# Altium footprint library CADTcommon.PcbLib: 503 footprints (part 20 of 32)
Each footprint in its own frame and in the unit in brackets; x right, y up, seen from the top. Pads: shape width x height; smd on the part's side, far side on the other; paste and mask are expansions set on the pad; w line width, h text height; cw(c..) or ccw(c..) is an arc to the next point about the centre after c.
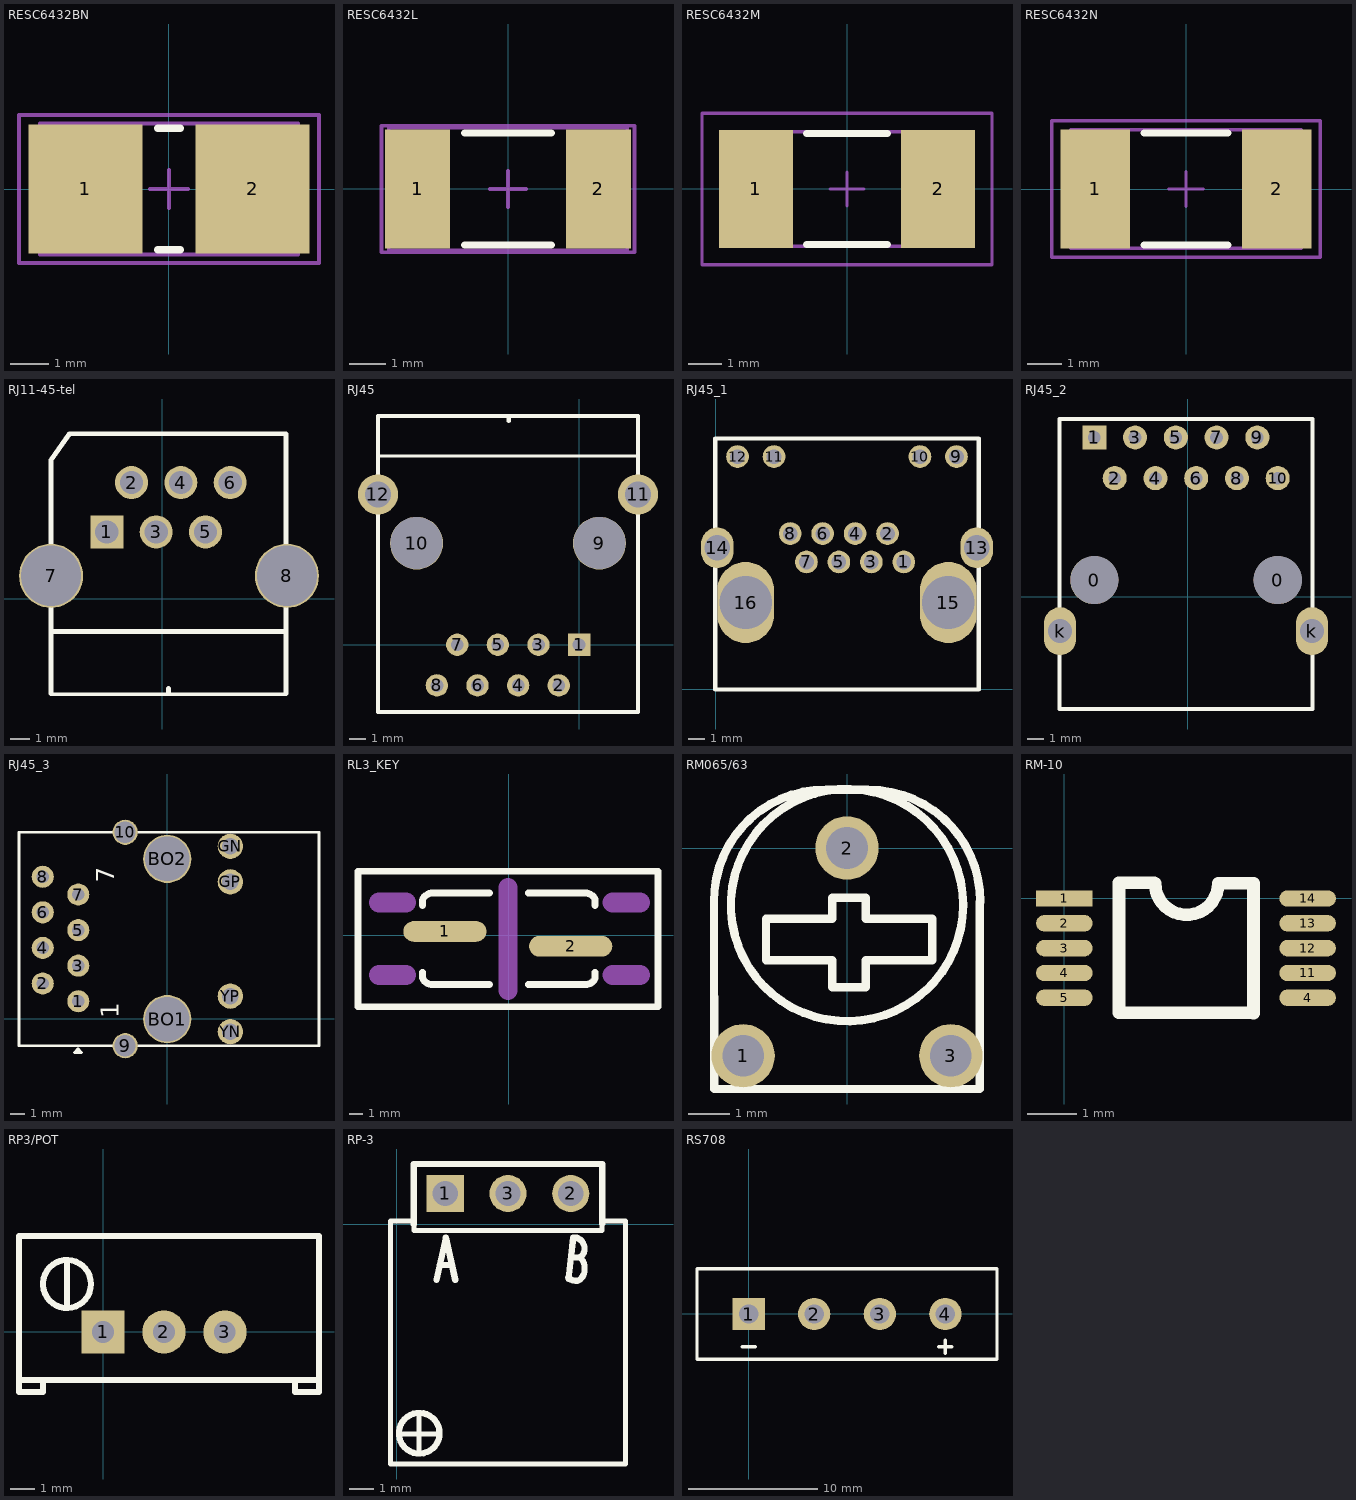
[diagram p19: the footprints below, top view; thin cyan lines are the x and y axes]

## RESC6432BN [mm] "Chip Resistor, Body 6.4x3.2mm, IPC Medium Density"
height 1.1
pads (2):
  rect 3x3.4 smd: 1(-2.2,0) 2(2.2,0)
Top Overlay:
  lines w0.2: -0.3,-1.6 0.3,-1.6 ; -0.3,1.6 0.3,1.6
Mechanical 13:
  lines w0.1: -3.4,-1.725 -3.4,1.725 3.4,1.725 3.4,-1.725 -3.4,-1.725
Mechanical 15:
  lines w0.1: -0.5,0 0.5,0 ; 0,-0.5 0,0.5 ; -3.95,-1.95 -3.95,1.95 3.95,1.95 3.95,-1.95 -3.95,-1.95
3D body: height 1.1, standoff 0, extent -3.4,-1.725 3.4,1.725

## RESC6432L [mm] "Chip Resistor, Body 6.4x3.2mm, IPC High Density"
height 1.2
pads (2):
  rect 1.8x3.3 smd: 1(-2.5,0) 2(2.5,0)
Top Overlay:
  lines w0.2: -1.2,-1.55 1.2,-1.55 ; -1.2,1.55 1.2,1.55
Mechanical 13:
  lines w0.1: -3.3,-1.7 -3.3,1.7 3.3,1.7 3.3,-1.7 -3.3,-1.7
Mechanical 15:
  lines w0.1: -0.5,0 0.5,0 ; 0,-0.5 0,0.5 ; -3.5,-1.75 -3.5,1.75 3.5,1.75 3.5,-1.75 -3.5,-1.75
3D body: height 1.2, standoff 0, extent -3.3,-1.7 3.3,1.7

## RESC6432M [mm] "Chip Resistor, Body 6.4x3.2mm, IPC Low Density"
height 1.2
pads (2):
  rect 2.2x3.5 smd: 1(-2.7,0) 2(2.7,0)
Top Overlay:
  lines w0.2: -1.2,-1.65 1.2,-1.65 ; -1.2,1.65 1.2,1.65
Mechanical 13:
  lines w0.1: -3.3,-1.7 3.3,-1.7 3.3,1.7 -3.3,1.7 -3.3,-1.7
Mechanical 15:
  lines w0.1: -0.5,0 0.5,0 ; 0,-0.5 0,0.5 ; -4.3,-2.25 4.3,-2.25 4.3,2.25 -4.3,2.25 -4.3,-2.25
3D body: height 1.2, standoff 0, extent -3.3,-1.7 3.3,1.7

## RESC6432N [mm] "Chip Resistor, Body 6.4x3.2mm, IPC Medium Density"
height 1.2
pads (2):
  rect 2x3.4 smd: 1(-2.6,0) 2(2.6,0)
Top Overlay:
  lines w0.2: -1.2,-1.6 1.2,-1.6 ; -1.2,1.6 1.2,1.6
Mechanical 13:
  lines w0.1: -3.3,-1.7 -3.3,1.7 3.3,1.7 3.3,-1.7 -3.3,-1.7
Mechanical 15:
  lines w0.1: -0.5,0 0.5,0 ; 0,-0.5 0,0.5 ; -3.85,-1.95 -3.85,1.95 3.85,1.95 3.85,-1.95 -3.85,-1.95
3D body: height 1.2, standoff 0, extent -3.3,-1.7 3.3,1.7

## RJ11-45-tel [mm]
pads (8):
  rect 1.7x1.7 hole 1.2: 1(-2.845,3.429)
  round 1.7 hole 1.2: 2(-1.575,5.969) 3(-0.305,3.429) 4(0.965,5.969) 5(2.235,3.429) 6(3.505,5.969)
  round 3.302 hole 3.1 unplated: 7(-5.715,1.168) 8(6.426,1.168)
Top Overlay:
  lines w0.203: -5.715,-4.928 6.375,-4.928
  lines w0.254: -5.715,-4.902 -5.715,7.137 -4.775,8.484 6.375,8.484 6.375,-4.902 ; -5.715,-1.702 6.35,-1.702 ; 0.33,-4.826 0.33,-4.626
3D body: height 3.77, standoff -10.45, extent -6.896,-7.312 7.963,8.988

## RJ45 [mil]
pads (12):
  rect 55x55 hole 31.5: 1(0,0)
  round 55 hole 31.5: 2(-50,-100) 3(-100,0) 4(-150,-100) 5(-200,0) 6(-250,-100) 7(-300,0) 8(-350,-100)
  round 130 hole 127.95 unplated: 9(50,250) 10(-400,250)
  round 98.42 hole 62.99: 11(145,370) 12(-495,370)
Top Overlay:
  lines w8: -488.19,464.57 141.73,464.57
  lines w10: -495,-165.35 144.65,-165.35 145,-165 145,370 145,562.99 -495,562.99 -495,370 -495,-165 ; -173.23,551.18 -173.23,559.06
3D body: height 127.85, standoff -555.12, extent -490,-172.17 139.92,556.17

## RJ45_1 [mil]
pads (16):
  round 56 hole 36: 1(464.02,314.02) 2(424.02,384.02) 3(384.02,314.02) 4(344.02,384.02) 5(304.02,314.02) 6(264.02,384.02) 7(224.02,314.02) 8(184.02,384.02) 9(594.02,574.02) 10(504.02,574.02) 11(144.02,574.02) 12(54.02,574.02)
  oval 80x100 hole 63: 13(644.02,349.02) 14(4.02,349.02)
  oval 140x200 hole 130: 15(574.02,214.02) 16(74.02,214.02)
Top Overlay:
  lines w10: -0.98,-0.98 -0.98,619.02 649.02,619.02 649.02,-0.98 -0.98,-0.98

## RJ45_2 [mm]
pads (14):
  round 3 hole 3: 0(-5.832,1.027) 0(5.598,1.027)
  rect 1.5x1.5 hole 0.8: 1(-5.832,9.917)
  round 1.5 hole 0.8: 2(-4.562,7.377) 3(-3.292,9.917) 4(-2.022,7.377) 5(-0.752,9.917) 6(0.518,7.377) 7(1.788,9.917) 8(3.058,7.377) 9(4.328,9.917) 10(5.598,7.377)
  oval 2x3 hole 1.5: k(-7.968,-2.162) k(7.732,-2.162)
Top Overlay:
  lines w0.254: -7.992,-7.013 -7.992,11.067 7.758,11.067 7.758,-7.013 -7.992,-7.013

## RJ45_3 [mil]
pads (16):
  round 62 hole 35: 1(-250.62,49.5) 2(-350.62,99.5) 3(-250.62,149.5) 4(-350.62,199.5) 5(-250.62,249.5) 6(-350.62,299.5) 7(-250.62,349.5) 8(-350.62,399.5)
  round 70.87 hole 59.06: 9(-118.73,-75.5) 10(-118.73,524.5)
  round 135 hole 125: BO1(-0.62,-0.5) BO2(-0.62,449.5)
  round 70.87 hole 47.24: GN(176.54,485.13) GP(176.54,385.13) YN(176.54,-36.13) YP(176.54,63.87)
Top Overlay:
  lines w8: -417.29,-75.5 425.82,-75.5 425.82,524.5 -417.29,524.5 -417.29,-75.5 ; -261.39,-94.04 -251.39,-84.04 -241.39,-94.04 -246.39,-94.04 -261.39,-94.04
  text "7" at -149.56,381.95 h50
  text "1" at -136.5,1.66 h50

## RL3_KEY [mm]
pads (2):
  oval 6x1.5 all layers, no hole: 1(-4.61,0.279) 2(4.458,-0.787)
Top Overlay:
  lines w0.5: -6.223,-2.667 -6.223,-2.995 ccw(c-5.789,-2.995) -6.096,-3.302 ccw(c-5.483,-2.689) -5.483,-3.556 -1.397,-3.556 ; -6.223,2.159 -6.223,2.487 cw(c-5.789,2.487) -6.096,2.794 cw(c-5.483,2.181) -5.483,3.048 -1.397,3.048 ; 1.397,-3.556 5.483,-3.556 ccw(c5.483,-2.689) 6.096,-3.302 ccw(c5.789,-2.995) 6.223,-2.995 6.223,-2.667 ; 1.397,3.048 5.483,3.048 cw(c5.483,2.181) 6.096,2.794 cw(c5.789,2.487) 6.223,2.487 6.223,2.159 ; -10.884,-5.156 -10.884,4.623 10.757,4.623 10.757,-5.156 -10.884,-5.156
Mechanical 1:
  lines w1.15: -6.871,0.279 -2.349,0.279 ; 2.197,-0.787 6.718,-0.787
  lines w1.4: -0.064,-3.962 -0.064,3.429
  lines w1.45: -9.373,-2.86 -7.417,-2.86 ; -9.373,2.362 -7.417,2.362 ; 7.493,-2.86 9.449,-2.86 ; 7.493,2.362 9.449,2.362

## RM065/63 [mm]
pads (3):
  round 1.524 hole 1: 1(-2.5,-5) 2(0,0) 3(2.5,-5)
Top Overlay:
  circle w0.203: c0,-1.375 r2.795
  lines w0.203: -0.5,1.4 0.5,1.4 ; -0.5,1.405 ccw(c-0.524,-1.273) -3.202,-1.3 -3.2,-5.8 3.2,-5.8 3.2,-1.3 ; 0.45,-2.7 0.45,-3.35 -0.35,-3.35 -0.35,-2.7 -1.95,-2.7 -1.95,-1.7 -0.35,-1.7 -0.35,-1.2 0.45,-1.2 0.45,-1.7 2.05,-1.7 2.05,-2.7 0.475,-2.7 ; 0.5,1.402 cw(c0.527,-1.276) 3.205,-1.3
3D body: height 7.7, standoff -3.1, extent -3.25,-5.799 3.25,1.444

## RM-10 [mm]
pads (10):
  rect 1.143x0.33 smd: 1(0,0)
  oval 1.143x0.33 smd: 2(0,-0.5) 3(0,-1) 4(0,-1.5) 4(4.9,-2) 5(0,-2) 11(4.9,-1.5) 12(4.9,-1) 13(4.9,-0.5) 14(4.9,0)
Top Overlay:
  lines w0.254: 1.814,0.32 1.1,0.32 1.1,-2.3 3.799,-2.3 ; 1.829,0.305 ccw(c2.464,0.305) 3.099,0.305 3.806,0.305 ; 3.81,-2.311 3.81,0.309

## RP3/POT [mm]
pads (3):
  rect 1.8x1.8 hole 0.9: 1(0,0)
  round 1.8 hole 0.9: 2(2.54,0) 3(5.08,0)
Top Overlay:
  circle w0.254: c-1.5,2 r1
  lines w0.254: -2.5,-2 -2.5,-2.5 -3.5,-2.5 -3.5,-2 ; -1.5,1 -1.5,3 ; 8,-2 8,-2.5 9,-2.5 9,-2 ; -3.5,-2 9,-2 ; -3.5,-2 -3.5,4 9,4 9,-2
3D body: height 12.46, standoff -5.04, extent -2.06,-2.438 7.14,2.362

## RP-3 [mil]
pads (3):
  rect 59.06x59.06 hole 40: 1(77,49)
  round 59.06 hole 40: 2(277,49) 3(177,49)
Top Overlay:
  circle w10: c35.61,-333 r32.39
  lines w7.87: 4,-334 67,-334 ; 35,-360 35,-304 ; 327,5 327,-10 27,-10 27,5 -10,5 -10,-382 364,-382 364,5 330,5
  lines w10: 27,0 27,96 327,96 327,1 ; 63,-89 78,-21 93,-89 ; 68.29,-65 87.71,-65 ; 273,-85 ccw(c285.07,-72.93) 285.07,-90 285.76,-90 ccw(c285.76,-79.76) 293,-87 ccw(c278.51,-72.51) 299,-72.51 299,-68.97 ccw(c277.34,-68.97) 292.66,-53.66 ; 273.56,-87.06 281,-21 ; 279,-53 289.1,-53 ccw(c289.1,-46) 294.05,-50.95 ccw(c282.1,-39) 299,-39 ; 282.34,-21 cw(c282.34,-34.66) 292,-25 ; 292.64,-24.64 cw(c277.27,-40) 299,-40
3D body: height 196.85, standoff 7.87, extent 0.37,-416.25 362.57,272.73

## RP-9 [mm]
3D body: height 4.3, standoff -4.2, extent -4.011,-0.635 18.489,0.615

## RS708 [mm]
pads (4):
  rect 2.5x2.5 hole 1.5: 1(0.004,-0.013)
  round 2.5 hole 1.5: 2(5.084,-0.013) 3(10.164,-0.013) 4(15.244,-0.013)
Top Overlay:
  lines w0.254: -0.504,-2.553 0.512,-2.553 ; 14.736,-2.553 15.752,-2.553 ; 15.244,-3.061 15.244,-2.045 ; -3.996,-3.513 -3.996,-0.013 -3.996,3.487 19.244,3.487 19.244,-0.013 19.244,-3.513 -3.996,-3.513
3D body: height 10.21, standoff -26.42, extent -3.531,-2.388 18.769,1.372